# Altium footprint library camara_Trap.PcbLib: 29 footprints (part 2 of 2)
Each footprint in its own frame and in the unit in brackets; x right, y up, seen from the top. Pads: shape width x height; smd on the part's side, far side on the other; paste and mask are expansions set on the pad; w line width, h text height; cw(c..) or ccw(c..) is an arc to the next point about the centre after c.
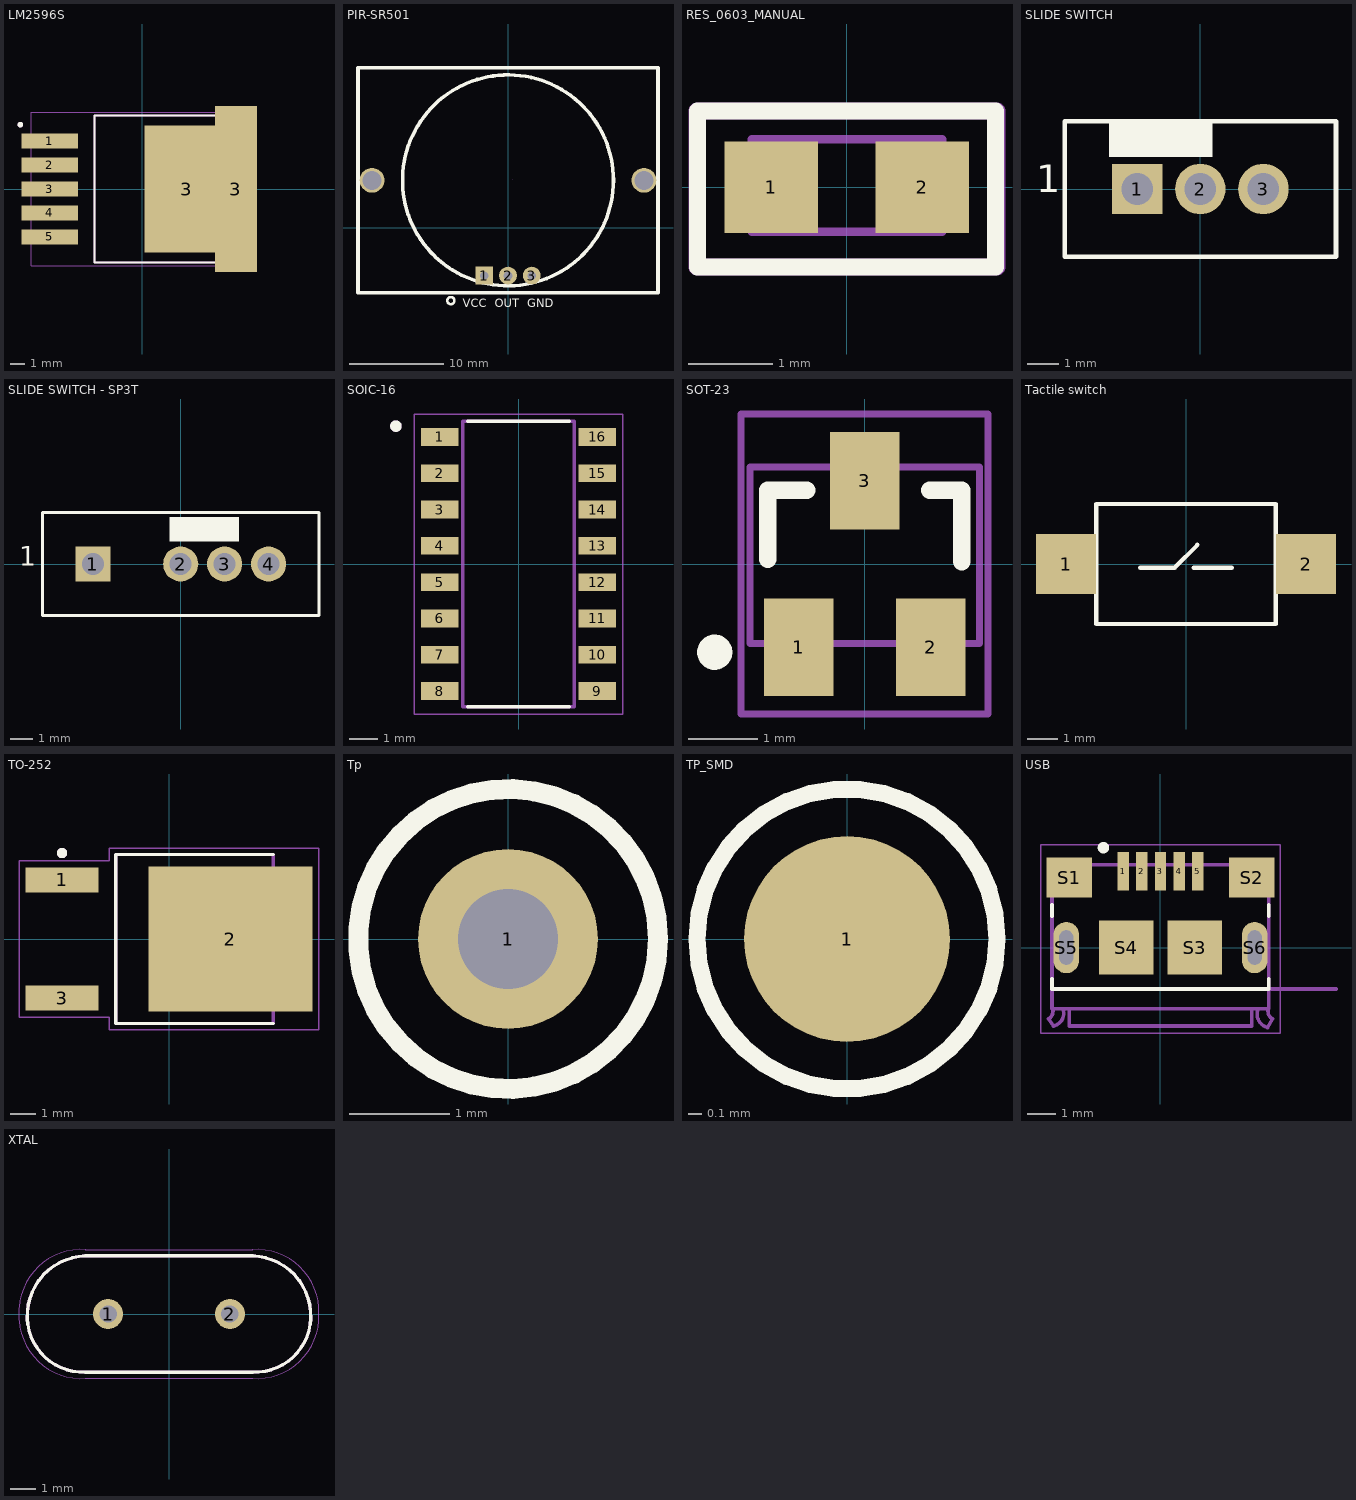
[diagram p1: the footprints below, top view; thin cyan lines are the x and y axes]

## LM2596S [mm]
height 4.65
pads (7):
  rect 4x1.07 smd: 1(-6.545,3.4) 2(-6.545,1.7) 3(-6.545,0) 4(-6.545,-1.7) 5(-6.545,-3.4)
  rect 6x9 smd paste-5: 3(3.175,0)
  rect 3x11.8 smd paste-6: 3(6.67,0)
Top Overlay:
  circle w0.2: c-8.636,4.572 r0.1
  lines w0.127: 5.402,-5.21 -3.37,-5.21 -3.37,5.21 5.402,5.21
Top Paste:
  region: 4.925,-0.61 3.335,-0.61 3.335,0.61 4.925,0.61
  region: 2.595,-0.61 1.005,-0.61 1.005,0.61 2.595,0.61
  region: 7.255,-0.61 5.665,-0.61 5.665,0.61 7.255,0.61
  region: 2.595,1.05 1.005,1.05 1.005,2.27 2.595,2.27
  region: 2.595,2.71 1.005,2.71 1.005,3.93 2.595,3.93
  region: 4.925,1.05 3.335,1.05 3.335,2.27 4.925,2.27
  region: 4.925,2.71 3.335,2.71 3.335,3.93 4.925,3.93
  region: 7.255,1.05 5.665,1.05 5.665,2.27 7.255,2.27
  region: 7.255,2.71 5.665,2.71 5.665,3.93 7.255,3.93
  region: 2.595,-2.27 1.005,-2.27 1.005,-1.05 2.595,-1.05
  region: 2.595,-3.93 1.005,-3.93 1.005,-2.71 2.595,-2.71
  region: 4.925,-2.27 3.335,-2.27 3.335,-1.05 4.925,-1.05
  region: 4.925,-3.93 3.335,-3.93 3.335,-2.71 4.925,-2.71
  region: 7.255,-2.27 5.665,-2.27 5.665,-1.05 7.255,-1.05
  region: 7.255,-3.93 5.665,-3.93 5.665,-2.71 7.255,-2.71
Mechanical 13:
  circle w0.2: c-8.636,4.572 r0.1
  lines w0.127: -3.37,-5.21 -3.37,5.21 5.53,5.21 5.53,-5.21 -3.37,-5.21
Mechanical 15:
  lines w0.05: -7.88,-5.46 -7.88,5.46 5.465,5.46 5.465,5.65 7.88,5.65 7.88,-5.65 5.465,-5.65 5.465,-5.46 -7.88,-5.46
3D body "step_temp.STEP": height 4.65, standoff -0.15, extent -7.175,-5.08 7.175,5.08

## PIR-SR501 [mil]
pads (5):
  rect 75x75 hole 36: 1(-100,-200)
  round 75 hole 36: 2(0,-200) 3(100,-200)
  round 104 hole 80: ""(-570.9,200) ""(570.9,200)
Top Overlay:
  circle w10: c-240,-305 r15
  circle w15.24: c0,200 r442.91
  lines w15.24: -629.92,-272.44 629.92,-272.44 629.92,672.44 -629.92,672.44 -629.92,-272.44
  text "VCC" at -190,-345 h59.06
  text "OUT" at -55,-345 h59.06
  text "GND" at 80,-345 h59.06
Mechanical 15:
  lines w0.1: 19.99,204.99 20.01,205.01
3D body "User Library-zl262-3s_p2-54_l8-12_w2-54_h8-5.STEP": height 334.65, standoff -118.11, extent -159.84,-250 159.85,-150
3D body "User Library-PIR SENSOR hc-sr501.STEP": height 1122.05, standoff 141.73, extent -618.69,-278.34 668.7,678.36

## RES_0603_MANUAL [mil]
height 35.43
pads (2):
  rect 44x43 smd: 1(-35.43,0) 2(35.43,0)
Top Overlay:
  lines w8: -70,-37.44 70,-37.44 70,35.99 -70,35.99 -70,-37.44
Mechanical 13:
  lines w4: -44.71,-20.73 44.88,-20.73 44.88,22.6 -44.71,22.6 -44.71,-20.73
Mechanical 15:
  lines w8: -70.34,-37.44 70.63,-37.44 70.63,35.99 -70.34,35.99 -70.34,-37.44
3D body "User Library-RES_1609-0603.step": height 22.05, standoff 0, extent -33.47,-16.3 33.47,15.19

## SLIDE SWITCH [mm]
pads (3):
  rect 1.6x1.6 hole 1 mask+0.08: 1(-2,0)
  round 1.6 hole 1 mask+0.08: 2(0,0) 3(2,0)
Top Overlay:
  rectangle: -2.89,1.016 0.381,2.15
  lines w0.15: -4.3,-2.15 -4.3,2.15 4.3,2.15 4.3,-2.15 -4.3,-2.15
  text "1" at -5.207,-0.381 h1.5

## SLIDE SWITCH - SP3T [mm]
pads (4):
  rect 1.6x1.6 hole 1 mask+0.08: 1(-4,0)
  round 1.6 hole 1 mask+0.08: 2(0,0) 3(2,0) 4(4,0)
Top Overlay:
  rectangle: -0.508,1.016 2.667,2.15
  lines w0.15: -6.3,-2.35 -6.3,2.35 6.3,2.35 6.3,-2.35 -6.3,-2.35
  text "1" at -7.366,-0.381 h1.5

## SOIC-16 [mm]
height 1.8
pads (16):
  rect 1.31x0.62 smd: 1(-2.75,4.445) 2(-2.75,3.175) 3(-2.75,1.905) 4(-2.75,0.635) 5(-2.75,-0.635) 6(-2.75,-1.905) 7(-2.75,-3.175) 8(-2.75,-4.445) 9(2.75,-4.445) 10(2.75,-3.175) 11(2.75,-1.905) 12(2.75,-0.635) 13(2.75,0.635) 14(2.75,1.905) 15(2.75,3.175) 16(2.75,4.445)
Top Overlay:
  circle w0.2: c-4.291,4.826 r0.1
  lines w0.127: -1.775,-5 1.775,-5 ; -1.775,5 1.775,5
Mechanical 13:
  circle w0.2: c-4.291,4.826 r0.1
  lines w0.127: -1.95,-5 -1.95,5 1.95,5 1.95,-5 -1.95,-5
Mechanical 15:
  lines w0.05: -3.655,-5.25 -3.655,5.25 3.655,5.25 3.655,-5.25 -3.655,-5.25
3D body "step_temp.STEP": height 1.8, standoff 0, extent -3,-5 3,5

## SOT-23 [mm]
pads (3):
  rect 1x1.4 smd: 1(-0.95,-1.2) 2(0.95,-1.2) 3(0,1.2)
Top Overlay:
  circle w0.254: c-2.159,-1.27 r0.127
  lines w0.254: -1.397,0.067 -1.397,1.059 -0.833,1.059 ; 0.935,1.059 1.397,1.059 1.397,0.035
Mechanical 13:
  lines w0.1: -1.651,-1.143 1.651,-1.143 1.651,1.397 -1.651,1.397 -1.651,-1.143
Mechanical 15:
  lines w0.1: -1.778,-2.159 1.778,-2.159 1.778,2.159 -1.778,2.159 -1.778,-2.159
3D body "SOT-23-3-1.STEP": height 1.1, standoff 0, extent -1.487,-1.318 1.513,1.224

## Tactile switch [mm]
pads (2):
  rect 2x2 smd mask+0.08: 1(-4,0) 2(4,0)
Top Overlay:
  lines w0.15: -1.524,-0.127 -0.381,-0.127 0.381,0.635 ; 0.254,-0.127 1.524,-0.127 ; -3,-2 -3,2 3,2 3,-2 -3,-2

## TO-252 [mm]
pads (3):
  rect 2.83x0.97 smd: 1(-4.14,2.29) 3(-4.14,-2.29)
  rect 6.35x5.63 smd paste-4: 2(2.38,0)
Top Overlay:
  circle w0.2: c-4.14,3.325 r0.1
  lines w0.127: 4.03,-3.27 -2.065,-3.27 -2.065,3.27 4.03,3.27
Top Paste:
  region: 3.075,0.55 1.685,0.55 1.685,2.27 3.075,2.27
  region: 0.955,0.55 -0.435,0.55 -0.435,2.27 0.955,2.27
  region: 5.195,0.55 3.805,0.55 3.805,2.27 5.195,2.27
  region: 3.075,-2.27 1.685,-2.27 1.685,-0.55 3.075,-0.55
  region: 0.955,-2.27 -0.435,-2.27 -0.435,-0.55 0.955,-0.55
  region: 5.195,-2.27 3.805,-2.27 3.805,-0.55 5.195,-0.55
Mechanical 13:
  circle w0.2: c-4.14,3.325 r0.1
  lines w0.127: -2.065,-3.27 4.03,-3.27 4.03,3.27 -2.065,3.27 -2.065,-3.27
Mechanical 15:
  lines w0.05: -5.805,-3.025 -2.315,-3.025 -2.315,-3.52 5.805,-3.52 5.805,3.52 -2.315,3.52 -2.315,3.025 -5.805,3.025 -5.805,-3.025
3D body "step_temp.STEP": height 2.39, standoff -0.13, extent -4.953,-3.27 4.953,3.27

## Tp [mm]
pads (1):
  round 1.8 hole 1 mask+0.08: 1(0,0)
Top Overlay:
  circle w0.2: c0,0 r1.5

## TP_SMD [mm]
pads (1):
  round 1.5 smd mask+0.08: 1(0,0)
Top Overlay:
  circle w0.125: c0,0 r1.092

## USB [mm]
pads (13):
  rect 0.4x1.35 smd: 1(-1.3,2.675) 2(-0.65,2.675) 3(0,2.675) 4(0.65,2.675) 5(1.3,2.675)
  rect 1.6x1.4 smd: S1(-3.2,2.45) S2(3.2,2.45)
  rect 1.9x1.9 smd: S3(1.2,0) S4(-1.2,0)
  oval 0.9x1.8 hole 0.5 slot 1.2 at 90 deg: S5(-3.3,0) S6(3.3,0)
  round 0.5 hole 0.5 unplated: ""(-3.3,0) ""(3.3,0)
Top Overlay:
  circle w0.2: c-2,3.5 r0.1
  lines w0.127: -3.8,-1.45 3.8,-1.45 ; -3.8,-1.4 -3.8,-1.1 ; -3.8,1.1 -3.8,1.5 ; 3.8,-1.4 3.8,-1.1 ; 3.8,1.1 3.8,1.5
Mechanical 13:
  lines w0.127: -3.93,-2.5 -3.75,-2.75 ; -3.93,-2.5 ccw(c-4.065,-2.235) -3.8,-2.1 ; -3.746,-2.749 ccw(c-3.85,-2.3) -3.401,-2.196 ; -3.2,-2.2 -3.2,-2.75 3.2,-2.75 3.2,-2.2 ; 3.401,-2.198 ccw(c3.875,-2.325) 3.748,-2.799 ; 3.75,-2.8 3.93,-2.5 ; 3.8,-2.1 ccw(c4.065,-2.235) 3.93,-2.5 ; 6.15,-1.45 3.8,-1.45 ; -3.8,-2.1 -3.8,-2.15 3.8,-2.15 3.8,-1.45 ; -3.8,-2.1 -3.8,2.9 3.8,2.9 3.8,-1.45
  text "PCB END" at 4.75,-1.3 h0.41
Mechanical 15:
  lines w0.05: -4.2,-3 -4.2,3.6 4.2,3.6 4.2,-3 -4.2,-3
3D body "step_temp.STEP": height 2.85, standoff -0.75, extent -3.93,-2.76 3.93,2.95

## XTAL [mm]
pads (2):
  round 1.2 hole 0.7: 1(-2.44,0) 2(2.44,0)
Top Overlay:
  lines w0.127: -5.675,-0.169 cw(c-3.26,-0.085) -3.344,2.33 ; -5.675,-0.168 ccw(c-3.435,-0.09) -3.357,-2.33 ; -3.35,-2.33 3.35,-2.33 ; -3.35,2.33 3.35,2.33 ; 3.344,2.33 cw(c3.26,-0.085) 5.675,-0.169 ; 3.357,-2.33 ccw(c3.435,-0.09) 5.675,-0.168
Mechanical 13:
  lines w0.127: -5.675,-0.169 cw(c-3.26,-0.085) -3.344,2.33 ; -5.675,-0.168 ccw(c-3.435,-0.09) -3.357,-2.33 ; -3.35,-2.33 3.35,-2.33 ; -3.35,2.33 3.35,2.33 ; 3.344,2.33 cw(c3.26,-0.085) 5.675,-0.169 ; 3.357,-2.33 ccw(c3.435,-0.09) 5.675,-0.168
Mechanical 15:
  lines w0.05: -5.999,-0.264 ccw(c-3.51,-0.09) -3.336,-2.579 ; -6,-0.25 -6,0.25 ; -5.999,0.264 cw(c-3.51,0.09) -3.336,2.579 ; -3.35,-2.58 3.35,-2.58 ; -3.35,2.58 3.35,2.58 ; 3.336,-2.579 ccw(c3.51,-0.09) 5.999,-0.264 ; 3.336,2.579 cw(c3.51,0.09) 5.999,0.264 ; 6,-0.25 6,0.25
3D body "ECS-25-S-1.STEP": height 13.47, standoff -12.69, extent -5.671,-2.474 5.679,2.527